# Altium footprint library Connectors THD.PcbLib: 631 footprints (part 13 of 46)
Each footprint in its own frame and in the unit in brackets; x right, y up, seen from the top. Pads: shape width x height; smd on the part's side, far side on the other; paste and mask are expansions set on the pad; w line width, h text height; cw(c..) or ccw(c..) is an arc to the next point about the centre after c.
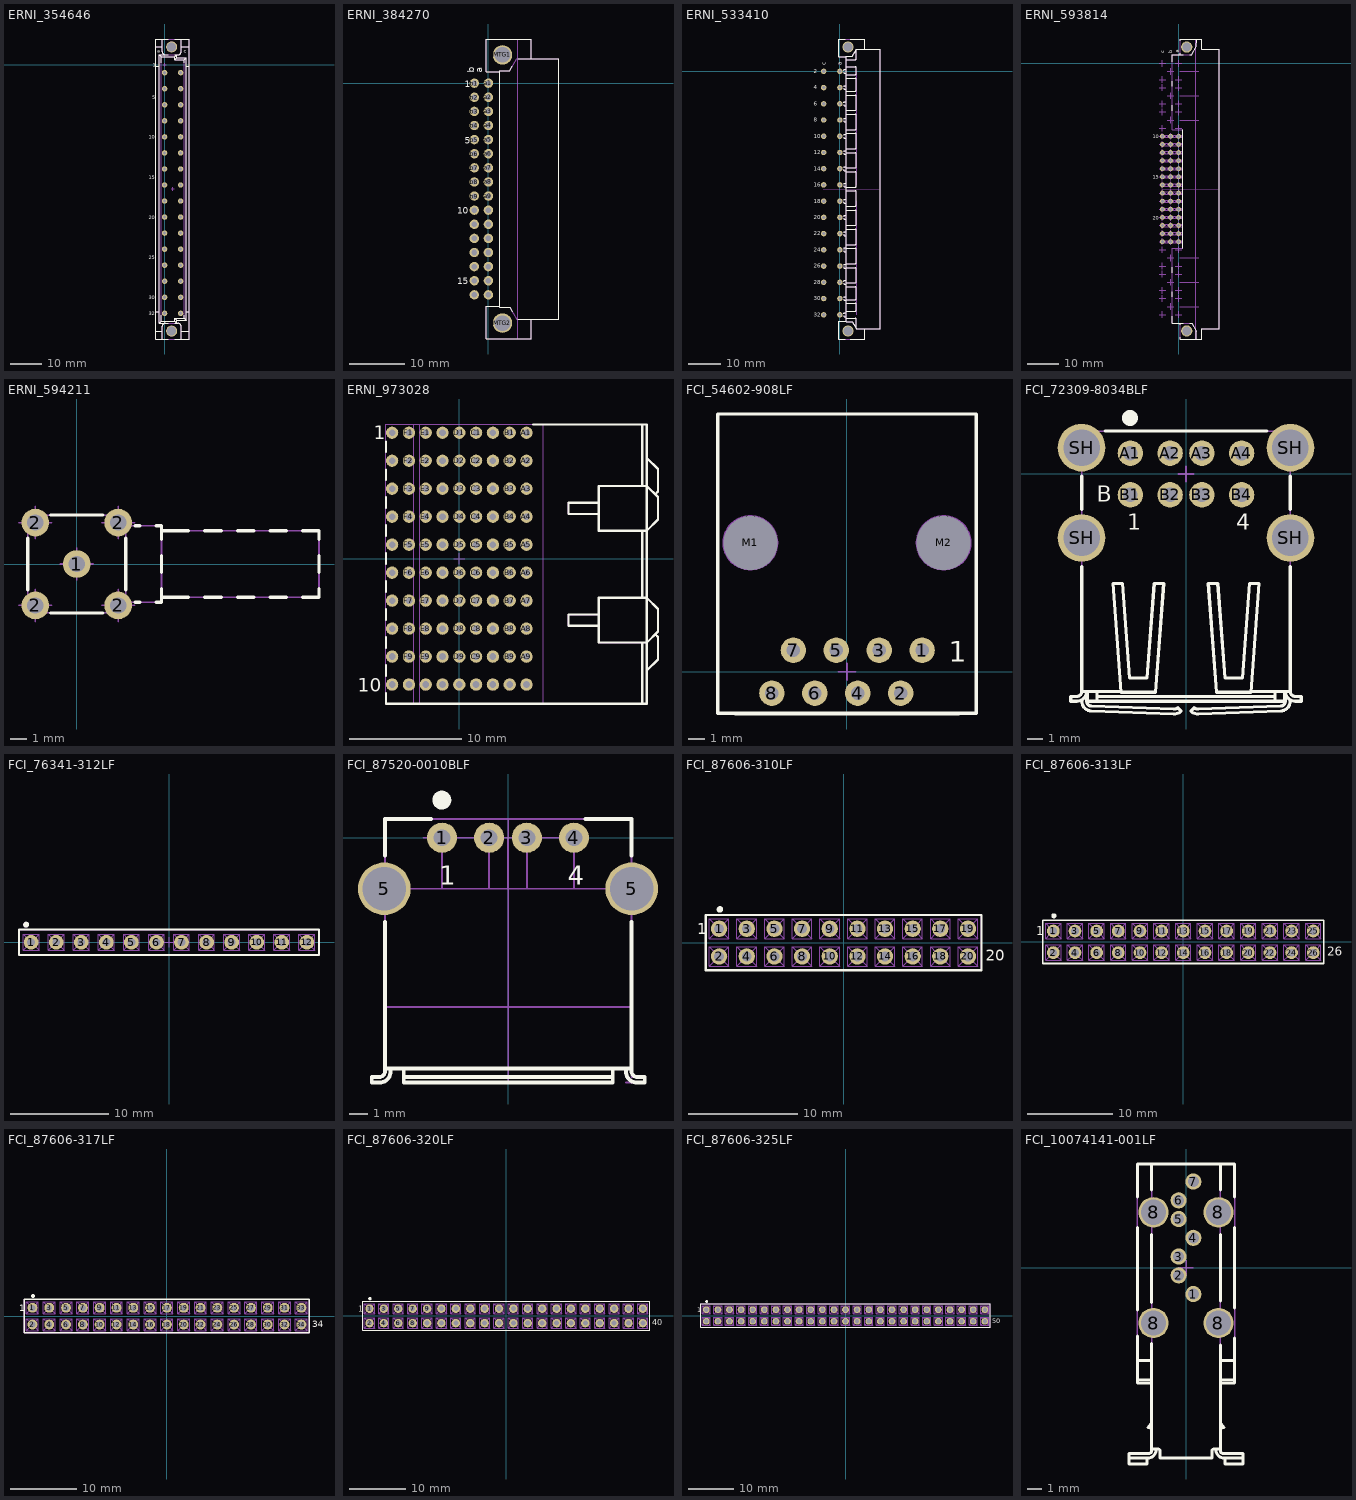
[diagram p12: the footprints below, top view; thin cyan lines are the x and y axes]

## ERNI_354646 [mm] "DIN 41612, Type D, Thru-Hole Pressfit Termination; Rows a+c, 32 Position, Performance level 2, Lead 4.5mm, Pitch 5.08mm, Straight Female Connector"
height 11.6
pads (34):
  round 1.7 hole 1: a2(0,-2.54) a4(0,-7.62) a6(0,-12.7) a8(0,-17.78) a10(0,-22.86) a12(0,-27.94) a14(0,-33.02) a16(0,-38.1) a18(0,-43.18) a20(0,-48.26) a22(0,-53.34) a24(0,-58.42) a26(0,-63.5) a28(0,-68.58) a30(0,-73.66) a32(0,-78.74) c2(5.08,-2.54) c4(5.08,-7.62) c6(5.08,-12.7) c8(5.08,-17.78) c10(5.08,-22.86) c12(5.08,-27.94) c14(5.08,-33.02) c16(5.08,-38.1) c18(5.08,-43.18) c20(5.08,-48.26) c22(5.08,-53.34) c24(5.08,-58.42) c26(5.08,-63.5) c28(5.08,-68.58) c30(5.08,-73.66) c32(5.08,-78.74)
  round 3.5 / inner round 3.5 / far side round 5.1 hole 2.8: MTG1(2.24,5.63) MTG2(2.24,-84.37)
Top Overlay:
  lines w0.2: -2.76,-84.47 -0.76,-84.47 ; -2.76,-78.27 -1.71,-78.27 ; -2.76,-0.47 -1.71,-0.47 ; -2.76,5.73 -0.76,5.73 ; -1.11,-79.315 -1.11,-81.27 ; -1.11,0.575 -1.11,2.53 ; -0.76,-86.87 -0.76,-82.87 cw(c0.24,-82.87) 0.24,-81.87 1.22,-81.87 -1.71,-81.87 ; -0.76,8.13 -0.76,4.13 ccw(c0.24,4.13) 0.24,3.13 1.22,3.13 -1.71,3.13 ; 1.22,-86.87 -2.76,-86.87 -2.76,8.13 1.22,8.13 ; 3.26,-86.87 7.84,-86.87 7.84,8.13 3.26,8.13 ; 5.24,-86.87 5.24,-82.87 ccw(c4.24,-82.87) 4.24,-81.87 3.26,-81.87 3.79,-81.87 ; 5.24,-84.47 7.84,-84.47 ; 5.24,5.73 7.84,5.73 ; 5.24,8.13 5.24,4.13 cw(c4.24,4.13) 4.24,3.13 3.26,3.13 3.79,3.13 ; 6.19,-79.315 6.19,-80.27 ; 6.19,0.575 6.19,1.53 ; 6.79,-78.27 7.84,-78.27 ; 6.79,-0.47 7.84,-0.47 ; -1.71,-81.87 -1.71,3.13 ; -1.71,-81.87 -1.11,-81.27 ; -1.71,3.13 -1.11,2.53 ; -1.11,-81.27 3.19,-81.27 ; -1.11,2.53 3.19,2.53 ; 3.19,-81.27 3.19,-80.27 ; 3.19,-81.27 3.79,-81.87 ; 3.19,-80.27 6.19,-80.27 ; 3.19,-80.27 3.79,-80.87 ; 3.19,1.53 3.19,2.53 ; 3.19,1.53 6.19,1.53 ; 3.19,1.53 3.79,2.13 ; 3.19,2.53 3.79,3.13 ; 3.79,-81.87 3.79,-80.87 ; 3.79,-80.87 6.79,-80.87 ; 3.79,2.13 3.79,3.13 ; 3.79,2.13 6.79,2.13 ; 6.19,-80.27 6.79,-80.87 ; 6.19,1.53 6.79,2.13 ; 6.79,-80.87 6.79,2.13
  text "c" at 6.032,3.81 h1.2
  text "a" at -2.286,3.81 h1.2
  text "32" at -5.05,-79.415 h1.2
  text "5" at -3.925,-10.885 h1.2
  text "10" at -5.05,-23.535 h1.2
  text "30" at -5.05,-74.335 h1.2
  text "25" at -5.05,-61.635 h1.2
  text "20" at -5.05,-48.935 h1.2
  text "15" at -5.05,-36.235 h1.2
  text "1" at -3.725,-0.725 h1.2
Mechanical 8:
  lines w0.1: -0.5,-78.74 0,-78.74 ; -0.5,-73.66 0,-73.66 ; -0.5,-2.54 0,-2.54 ; -0.5,0 0,0 ; 0,-79.24 0,-78.74 ; 0,-78.24 0,-78.74 ; 0,-74.16 0,-73.66 ; 0,-73.16 0,-73.66 ; 0,-3.04 0,-2.54 ; 0,-2.04 0,-2.54 ; 0,-0.5 0,0 ; 0,0.5 0,0 ; 0.5,-78.74 0,-78.74 ; 0.5,-73.66 0,-73.66 ; 0.5,-2.54 0,-2.54 ; 0.5,0 0,0 ; 1.74,-84.37 2.24,-84.37 ; 1.74,5.63 2.24,5.63 ; 2.04,-39.37 2.54,-39.37 ; 2.24,-84.87 2.24,-84.37 ; 2.24,-83.87 2.24,-84.37 ; 2.24,5.13 2.24,5.63 ; 2.24,6.13 2.24,5.63 ; 2.54,-39.87 2.54,-39.37 ; 2.54,-38.87 2.54,-39.37 ; 2.74,-84.37 2.24,-84.37 ; 2.74,5.63 2.24,5.63 ; 3.04,-39.37 2.54,-39.37 ; 4.58,-78.74 5.08,-78.74 ; 4.58,-73.66 5.08,-73.66 ; 4.58,-2.54 5.08,-2.54 ; 5.08,-79.24 5.08,-78.74 ; 5.08,-78.24 5.08,-78.74 ; 5.08,-74.16 5.08,-73.66 ; 5.08,-73.16 5.08,-73.66 ; 5.08,-3.04 5.08,-2.54 ; 5.08,-2.04 5.08,-2.54 ; 5.58,-78.74 5.08,-78.74 ; 5.58,-73.66 5.08,-73.66 ; 5.58,-2.54 5.08,-2.54
Mechanical 14:
  circle w0.1: c2.24,-84.37 r1.4
  circle w0.1: c2.24,5.63 r1.4
  circle w0.1: c2.24,-84.37 r1.425
  circle w0.1: c2.24,5.63 r1.425
  lines w0.1: -2.76,-84.47 -0.76,-84.47 ; -2.76,-78.27 -1.71,-78.27 ; -2.76,-0.47 -1.71,-0.47 ; -2.76,5.73 -0.76,5.73 ; -0.76,-86.87 -0.76,-82.87 cw(c0.24,-82.87) 0.24,-81.87 4.24,-81.87 cw(c4.24,-82.87) 5.24,-82.87 5.24,-86.87 ; -0.76,8.13 -0.76,4.13 ccw(c0.24,4.13) 0.24,3.13 4.24,3.13 ccw(c4.24,4.13) 5.24,4.13 5.24,8.13 ; 5.24,-84.47 7.84,-84.47 ; 5.24,5.73 7.84,5.73 ; 6.79,-78.27 7.84,-78.27 ; 6.79,-0.47 7.84,-0.47 ; -1.71,-81.87 3.79,-81.87 ; -1.71,-81.87 -1.71,3.13 ; -1.71,-81.87 -1.11,-81.27 ; -1.71,3.13 3.79,3.13 ; -1.71,3.13 -1.11,2.53 ; -1.11,-81.27 3.19,-81.27 ; -1.11,-81.27 -1.11,2.53 ; -1.11,2.53 3.19,2.53 ; 3.19,-81.27 3.19,-80.27 ; 3.19,-81.27 3.79,-81.87 ; 3.19,-80.27 6.19,-80.27 ; 3.19,-80.27 3.79,-80.87 ; 3.19,1.53 3.19,2.53 ; 3.19,1.53 6.19,1.53 ; 3.19,1.53 3.79,2.13 ; 3.19,2.53 3.79,3.13 ; 3.79,-81.87 3.79,-80.87 ; 3.79,-80.87 6.79,-80.87 ; 3.79,2.13 3.79,3.13 ; 3.79,2.13 6.79,2.13 ; 6.19,-80.27 6.19,1.53 ; 6.19,-80.27 6.79,-80.87 ; 6.19,1.53 6.79,2.13 ; 6.79,-80.87 6.79,2.13 ; -2.76,-86.87 7.84,-86.87 7.84,8.13 -2.76,8.13 -2.76,-86.87
  text "1" at -3.725,-0.725 h1.2
  text "c" at 6.032,3.81 h1.2
  text "a" at -2.286,3.81 h1.2
  text "32" at -5.05,-79.415 h1.2
  text "5" at -3.925,-10.885 h1.2
  text "10" at -5.05,-23.535 h1.2
  text "15" at -5.05,-36.235 h1.2
  text "20" at -5.05,-48.935 h1.2
  text "25" at -5.05,-61.635 h1.2
  text "30" at -5.05,-74.335 h1.2
Drill Drawing:
  lines w0.1: -2.54,-58.42 -2.54,-81.28 7.62,-81.28 7.62,0 -2.54,0 -2.54,-20.32
  text "PRESS-FIT TECHNOLOGY diam. 1mm +0.09 -0.06" at -1.905,-56.515 h1
3D body: height 11.5, standoff -4.3, extent -2.76,-86.87 7.84,8.13

## ERNI_384270 [mm] "DIN 41612, Type 2B, Thru-Hole Pressfit Terminations;  Rows a+b, 32 Positions, Performance Class 2, Lead 3 mm, Pitch 2.54mm, Right Angle Male Connector"
height 8.6
pads (34):
  round 1.7 hole 1: a1(0,0) a2(0,-2.54) a3(0,-5.08) a4(0,-7.62) a5(0,-10.16) a6(0,-12.7) a7(0,-15.24) a8(0,-17.78) a9(0,-20.32) a10(0,-22.86) a11(0,-25.4) a12(0,-27.94) a13(0,-30.48) a14(0,-33.02) a15(0,-35.56) a16(0,-38.1) b1(-2.54,0) b2(-2.54,-2.54) b3(-2.54,-5.08) b4(-2.54,-7.62) b5(-2.54,-10.16) b6(-2.54,-12.7) b7(-2.54,-15.24) b8(-2.54,-17.78) b9(-2.54,-20.32) b10(-2.54,-22.86) b11(-2.54,-25.4) b12(-2.54,-27.94) b13(-2.54,-30.48) b14(-2.54,-33.02) b15(-2.54,-35.56) b16(-2.54,-38.1)
  round 3.5 / inner round 3.5 / far side round 5.1 hole 2.8: MTG1(2.54,5.08) MTG2(2.54,-43.18)
Top Overlay:
  lines w0.2: 2.04,-40.18 -0.36,-40.18 -0.36,-46.05 7.69,-46.05 7.69,-42.5 ; 2.04,2.08 -0.36,2.08 -0.36,7.95 7.69,7.95 7.69,4.4 ; 4.32,-41.15 3.847,-40.33 2.04,-40.33 2.04,2.23 3.847,2.23 4.32,3.05 ; 5.3,-42.5 12.64,-42.5 12.64,4.4 5.3,4.4
  text "10" at -5.58,-23.535 h1.2
  text "5" at -4.255,-10.885 h1.2
  text "a" at -1.12,1.87 h1.2
  text "b" at -2.56,1.87 h1.2
  text "1" at -4.255,-0.725 h1.2
  text "15" at -5.58,-36.235 h1.2
Mechanical 8:
  drawing of 209 lines, arcs and shapes, not listed
  text "PCB" at 5.055,-19.45 h1.2
Mechanical 14:
  circle w0.1: c2.54,5.08 r1.25
  circle w0.1: c2.54,-43.18 r1.25
  lines w0.1: 2.04,-40.18 -0.36,-40.18 -0.36,-46.05 7.69,-46.05 7.69,-42.5 ; 2.04,2.08 -0.36,2.08 -0.36,7.95 7.69,7.95 7.69,4.4 ; 2.04,-40.33 3.847,-40.33 5.1,-42.5 12.64,-42.5 12.64,4.4 5.1,4.4 3.847,2.23 2.04,2.23 2.04,-40.33
  text "5" at -4.255,-10.885 h1.2
  text "1" at -4.255,-0.725 h1.2
  text "10" at -5.58,-23.535 h1.2
  text "15" at -5.58,-36.235 h1.2
Drill Drawing:
  lines w0.1: -3.9,-40.33 1.4,-40.33 1.4,2.08 -3.9,2.08 -3.9,-40.33
  text "PRESS-FIT TECHNOLOGY diam. 1mm +0.09 -0.06" at 3,-37.1 h1
3D body: height 6.83, standoff -3, extent -2.79,-46.05 12.64,7.95

## ERNI_533410 [mm] "Eurocard DIN 41612, Type C, 32 Position, Rows a+c, Performance level 2, Male, Lead 3.0 mm, Pitch 2.54 mm"
height 11
pads (34):
  round 1.7 hole 1: a2(0,0) a4(0,-5.08) a6(0,-10.16) a8(0,-15.24) a10(0,-20.32) a12(0,-25.4) a14(0,-30.48) a16(0,-35.56) a18(0,-40.64) a20(0,-45.72) a22(0,-50.8) a24(0,-55.88) a26(0,-60.96) a28(0,-66.04) a30(0,-71.12) a32(0,-76.2) c2(-5.08,0) c4(-5.08,-5.08) c6(-5.08,-10.16) c8(-5.08,-15.24) c10(-5.08,-20.32) c12(-5.08,-25.4) c14(-5.08,-30.48) c16(-5.08,-35.56) c18(-5.08,-40.64) c20(-5.08,-45.72) c22(-5.08,-50.8) c24(-5.08,-55.88) c26(-5.08,-60.96) c28(-5.08,-66.04) c30(-5.08,-71.12) c32(-5.08,-76.2)
  round 3.5 / inner round 3.5 / far side round 5.1 hole 2.8: MTG1(2.54,7.62) MTG2(2.54,-81.28)
Top Overlay:
  drawing of 163 lines, arcs and shapes, not listed
  text "30" at -8.22,-71.695 h1.2
  text "28" at -8.22,-66.615 h1.2
  text "20" at -8.22,-46.295 h1.2
  text "10" at -8.22,-20.895 h1.2
  text "32" at -8.22,-76.775 h1.2
  text "a" at 0.635,1.905 h1.2
  text "c" at -4.445,1.905 h1.2
  text "26" at -8.22,-61.535 h1.2
  text "24" at -8.22,-56.455 h1.2
  text "22" at -8.22,-51.375 h1.2
  text "18" at -8.22,-41.215 h1.2
  text "16" at -8.22,-36.135 h1.2
  text "14" at -8.22,-31.055 h1.2
  text "12" at -8.22,-25.975 h1.2
  text "8" at -8.22,-15.815 h1.2
  text "6" at -8.12,-10.735 h1.2
  text "4" at -8.12,-5.655 h1.2
  text "2" at -8.12,-0.575 h1.2
Mechanical 8:
  lines w0.1: -5.08,-36.83 12.64,-36.83
  text "PCB" at 5.08,-38.735 h1.2
Mechanical 14:
  drawing of 163 lines, arcs and shapes, not listed
  text "2" at -8.12,-0.575 h1.2
  text "4" at -8.12,-5.655 h1.2
  text "6" at -8.12,-10.735 h1.2
  text "8" at -8.22,-15.815 h1.2
  text "12" at -8.22,-25.975 h1.2
  text "14" at -8.22,-31.055 h1.2
  text "16" at -8.22,-36.135 h1.2
  text "18" at -8.22,-41.215 h1.2
  text "22" at -8.22,-51.375 h1.2
  text "24" at -8.22,-56.455 h1.2
  text "26" at -8.22,-61.535 h1.2
  text "32" at -8.22,-76.775 h1.2
  text "10" at -8.22,-20.895 h1.2
  text "20" at -8.22,-46.295 h1.2
  text "28" at -8.22,-66.615 h1.2
  text "30" at -8.22,-71.695 h1.2
  text "c" at -4.445,1.905 h1.2
  text "a" at 0.635,1.905 h1.2
  text "PCB" at 6.05,-40.1 h1.2
3D body: height 9.4, standoff -3, extent -5.38,-83.83 12.64,10.17

## ERNI_593814 [mm] "DIN 41612, Type M, 42 Contacts + 6 Spares  Positions for Specials Contacts, Right Angle Male Connector, Pitch 2.54 mm"
height 11
pads (44):
  round 1.5 hole 1: a10(0,-22.86) a11(0,-25.4) a12(0,-27.94) a13(0,-30.48) a14(0,-33.02) a15(0,-35.56) a16(0,-38.1) a17(0,-40.64) a18(0,-43.18) a19(0,-45.72) a20(0,-48.26) a21(0,-50.8) a22(0,-53.34) a23(0,-55.88) b10(-2.54,-22.86) b11(-2.54,-25.4) b12(-2.54,-27.94) b13(-2.54,-30.48) b14(-2.54,-33.02) b15(-2.54,-35.56) b16(-2.54,-38.1) b17(-2.54,-40.64) b18(-2.54,-43.18) b19(-2.54,-45.72) b20(-2.54,-48.26) b21(-2.54,-50.8) b22(-2.54,-53.34) b23(-2.54,-55.88) c10(-5.08,-22.86) c11(-5.08,-25.4) c12(-5.08,-27.94) c13(-5.08,-30.48) c14(-5.08,-33.02) c15(-5.08,-35.56) c16(-5.08,-38.1) c17(-5.08,-40.64) c18(-5.08,-43.18) c19(-5.08,-45.72) c20(-5.08,-48.26) c21(-5.08,-50.8) c22(-5.08,-53.34) c23(-5.08,-55.88)
  round 3.5 / inner round 3.5 / far side round 5.1 hole 2.8: MTG1(2.54,5.08) MTG2(2.54,-83.82)
Top Overlay:
  lines w0.2: -1.965,0.46 -1.96,2.63 1.5,2.63 ; -1.963,-73.2 -1.96,-71.58 ; -1.963,-65.58 -1.96,-63.96 ; -1.963,-14.78 -1.96,-13.16 ; -1.963,-7.16 -1.96,-5.54 ; -1.955,-79.2 -1.96,-81.37 1.5,-81.37 ; 0.54,-85.857 0.54,-86.37 7.24,-86.37 7.24,-83.17 12.74,-83.17 12.74,4.43 7.24,4.43 7.24,7.63 0.54,7.63 0.54,7.117 ; 0.54,-81.883 0.54,-81.37 ; 0.54,2.63 0.54,3.143 ; 1.29,-57.94 1.29,-20.8 ; 3.5,-81.37 4.04,-81.37 5.54,-83.87 5.54,-86.37 ; 3.5,2.63 4.04,2.63 5.54,5.13 5.64,7.63
  text "c" at -4.58,3.22 h1.2
  text "b" at -2.04,3.22 h1.2
  text "a" at 0,3.302 h1.2
  text "10" at -8.12,-23.535 h1.2
  text "15" at -8.12,-36.235 h1.2
  text "20" at -8.12,-48.935 h1.2
Mechanical 8:
  drawing of 314 lines, arcs and shapes, not listed
  text "PCB" at 5.08,-41.275 h1.2
Mechanical 14:
  lines w0.1: 0.54,-81.37 0.54,-86.37 7.24,-86.37 7.24,-83.17 12.74,-83.17 12.74,4.43 7.24,4.43 7.24,7.63 0.54,7.63 0.54,2.63 ; 1.29,-56.23 -5.38,-56.23 -5.38,-55.53 1.295,-55.53 ; 1.29,-53.69 -5.38,-53.69 -5.38,-52.99 1.295,-52.99 ; 1.29,-51.15 -5.38,-51.15 -5.38,-50.45 1.295,-50.45 ; 1.29,-48.61 -5.38,-48.61 -5.38,-47.91 1.295,-47.91 ; 1.29,-46.07 -5.38,-46.07 -5.38,-45.37 1.295,-45.37 ; 1.29,-43.53 -5.38,-43.53 -5.38,-42.83 1.295,-42.83 ; 1.29,-40.99 -5.38,-40.99 -5.38,-40.29 1.295,-40.29 ; 1.29,-38.45 -5.38,-38.45 -5.38,-37.75 1.295,-37.75 ; 1.29,-35.91 -5.38,-35.91 -5.38,-35.21 1.295,-35.21 ; 1.29,-33.37 -5.38,-33.37 -5.38,-32.67 1.295,-32.67 ; 1.29,-30.83 -5.38,-30.83 -5.38,-30.13 1.295,-30.13 ; 1.29,-28.29 -5.38,-28.29 -5.38,-27.59 1.295,-27.59 ; 1.29,-25.75 -5.38,-25.75 -5.38,-25.05 1.295,-25.05 ; 1.29,-23.21 -5.38,-23.21 -5.38,-22.51 1.295,-22.51 ; 5.54,-86.37 5.54,-83.87 4.04,-81.37 -1.96,-81.37 -1.96,-57.94 1.29,-57.94 1.29,-20.8 -1.96,-20.8 -1.96,2.63 4.04,2.63 5.54,5.13 5.64,7.63
  text "10" at -8.12,-23.535 h1.2
  text "20" at -8.12,-48.935 h1.2
3D body: height 9.4, standoff -3, extent -5.38,-86.37 12.74,7.63

## ERNI_594211 [mm] "Special Contacts for DIN Connectors, Coax Right Angle Female"
height 6
pads (5):
  round 1.7 hole 1: 1(0,0) 2(-2.54,-2.54) 2(-2.54,2.54) 2(2.54,-2.54) 2(2.54,2.54)
Top Overlay:
  lines w0.2: -3,-1.596 -3,1.596 ; -1.596,-3 1.596,-3 ; -1.596,3 1.596,3 ; 3,-1.596 3,1.596 ; 3.573,-2.35 3.86,-2.35 ; 3.573,2.35 3.86,2.35 ; 4.86,-2.35 5.2,-2.35 5.2,-1.5 ; 4.86,2.35 5.2,2.35 5.2,1.5 ; 5.2,-2.035 6.86,-2.035 ; 5.2,-0.5 5.2,0.5 ; 5.2,2.035 6.86,2.035 ; 7.86,-2.035 8.86,-2.035 ; 7.86,2.035 8.86,2.035 ; 9.86,-2.035 10.86,-2.035 ; 9.86,2.035 10.86,2.035 ; 11.86,-2.035 12.86,-2.035 ; 11.86,2.035 12.86,2.035 ; 13.86,-2.035 14.86,-2.035 ; 13.86,2.035 14.86,2.035 14.86,1.5 ; 14.86,-2.035 14.86,-1.5 14.86,-2.035 ; 14.86,-0.5 14.86,0.5 14.86,-0.5
Mechanical 8:
  lines w0.1: -3.54,-2.54 -2.54,-2.54 ; -3.54,2.54 -2.54,2.54 ; -2.54,-3.54 -2.54,-2.54 ; -2.54,-1.54 -2.54,-2.54 ; -2.54,1.54 -2.54,2.54 ; -2.54,3.54 -2.54,2.54 ; -1.54,-2.54 -2.54,-2.54 ; -1.54,2.54 -2.54,2.54 ; -1,0 0,0 ; 0,-1 0,0 ; 0,1 0,0 ; 1,0 0,0 ; 1.54,-2.54 2.54,-2.54 ; 1.54,2.54 2.54,2.54 ; 2.54,-3.54 2.54,-2.54 ; 2.54,-1.54 2.54,-2.54 ; 2.54,1.54 2.54,2.54 ; 2.54,3.54 2.54,2.54 ; 3.54,-2.54 2.54,-2.54 ; 3.54,2.54 2.54,2.54
Mechanical 14:
  lines w0.1: 3,-2.35 5.2,-2.35 5.2,2.35 3,2.35 ; 5.2,-2.035 14.86,-2.035 14.86,2.035 5.2,2.035 ; -3,-3 -3,3 3,3 3,-3 -3,-3
3D body: height 6.85, standoff -2.75, extent -3,-3 14.86,3

## ERNI_973028 [mm] "90 Contacts (30 pairs/10Wafer), 6 Rows  (a,b,c,d,e,f) of 10 positions + 3 Shield Row (ab, cd, ef) of  10 Positions, Pitch 2 mm,  Press-Fit, Right Angle ERmet ZD High Speed Differential Hard Metric Female Connector"
height 16.9
pads (90):
  round 1.1 hole 0.6: A1(6,11.25) A2(6,8.75) A3(6,6.25) A4(6,3.75) A5(6,1.25) A6(6,-1.25) A7(6,-3.75) A8(6,-6.25) A9(6,-8.75) A10(6,-11.25) AB1(3,11.25) AB2(3,8.75) AB3(3,6.25) AB4(3,3.75) AB5(3,1.25) AB6(3,-1.25) AB7(3,-3.75) AB8(3,-6.25) AB9(3,-8.75) AB10(3,-11.25) B1(4.5,11.25) B2(4.5,8.75) B3(4.5,6.25) B4(4.5,3.75) B5(4.5,1.25) B6(4.5,-1.25) B7(4.5,-3.75) B8(4.5,-6.25) B9(4.5,-8.75) B10(4.5,-11.25) C1(1.5,11.25) C2(1.5,8.75) C3(1.5,6.25) C4(1.5,3.75) C5(1.5,1.25) C6(1.5,-1.25) C7(1.5,-3.75) C8(1.5,-6.25) C9(1.5,-8.75) C10(1.5,-11.25) CD1(-1.5,11.25) CD2(-1.5,8.75) CD3(-1.5,6.25) CD4(-1.5,3.75) CD5(-1.5,1.25) CD6(-1.5,-1.25) CD7(-1.5,-3.75) CD8(-1.5,-6.25) CD9(-1.5,-8.75) CD10(-1.5,-11.25) D1(0,11.25) D2(0,8.75) D3(0,6.25) D4(0,3.75) D5(0,1.25) D6(0,-1.25) D7(0,-3.75) D8(0,-6.25) D9(0,-8.75) D10(0,-11.25) E1(-3,11.25) E2(-3,8.75) E3(-3,6.25) E4(-3,3.75) E5(-3,1.25) E6(-3,-1.25) E7(-3,-3.75) E8(-3,-6.25) E9(-3,-8.75) E10(-3,-11.25) EF1(-6,11.25) EF2(-6,8.75) EF3(-6,6.25) EF4(-6,3.75) EF5(-6,1.25) EF6(-6,-1.25) EF7(-6,-3.75) EF8(-6,-6.25) EF9(-6,-8.75) EF10(-6,-11.25) F1(-4.5,11.25) F2(-4.5,8.75) F3(-4.5,6.25) F4(-4.5,3.75) F5(-4.5,1.25) F6(-4.5,-1.25) F7(-4.5,-3.75) F8(-4.5,-6.25) F9(-4.5,-8.75) F10(-4.5,-11.25)
Top Overlay:
  lines w0.2: -6.55,-12.025 -6.55,-12.955 16.75,-12.955 16.75,11.995 6.589,11.995 ; -6.55,-10.475 -6.55,-9.525 ; -6.55,-7.975 -6.55,-7.025 ; -6.55,-5.475 -6.55,-4.525 ; -6.55,-2.975 -6.55,-2.025 ; -6.55,-0.475 -6.55,0.475 ; -6.55,2.025 -6.55,2.975 ; -6.55,4.525 -6.55,5.475 ; -6.55,7.025 -6.55,7.975 ; -6.55,9.525 -6.55,10.475 ; 12.45,-6 9.75,-6 9.75,-5 12.45,-5 ; 12.45,4 9.75,4 9.75,5 12.45,5 ; 16.35,6.5 16.35,11.995 ; 16.351,-12.955 16.351,-7.5 ; 16.351,-3.5 16.351,2.5 ; 16.75,-10 17.75,-9 17.75,-7 17.5,-6.75 ; 16.75,9 17.75,8 17.75,6 17.5,5.75 ; 12.45,-7.5 16.75,-7.5 17.75,-6.5 17.75,-4.5 16.75,-3.5 12.45,-3.5 12.45,-7.5 ; 12.45,2.5 16.75,2.5 17.75,3.5 17.75,5.5 16.75,6.5 12.45,6.5 12.45,2.5
  text "10" at -9.05,-11.875 h1.2
  text "1" at -7.65,10.675 h1.2
Mechanical 8:
  drawing of 366 lines, arcs and shapes, not listed
Mechanical 14:
  lines w0.1: -4.05,-12.955 -4.05,11.995 ; -3.55,-12.955 -3.55,11.995 ; 12.45,-6 9.75,-6 9.75,-5 12.45,-5 ; 12.45,4 9.75,4 9.75,5 12.45,5 ; 16.35,6.5 16.35,11.995 ; 16.351,-12.955 16.351,-7.5 ; 16.351,-3.5 16.351,2.5 ; 16.75,-10 17.75,-9 17.75,-7 17.5,-6.75 ; 16.75,9 17.75,8 17.75,6 17.5,5.75 ; -6.55,-12.955 16.75,-12.955 16.75,11.995 -6.55,11.995 -6.55,-12.955 ; 12.45,-7.5 16.75,-7.5 17.75,-6.5 17.75,-4.5 16.75,-3.5 12.45,-3.5 12.45,-7.5 ; 12.45,2.5 16.75,2.5 17.75,3.5 17.75,5.5 16.75,6.5 12.45,6.5 12.45,2.5
  text "10" at -9.05,-11.875 h1.2
  text "1" at -7.65,10.675 h1.2
Drill Drawing:
  lines w0.1: -6.55,-12.005 -6.55,11.995 ; -6.55,-12 6.815,-12 6.815,12 -6.55,12
  text "diam. 0.6mm +/-0.05" at 9.875,-8.35 h1
  text "PRESS-FIT TECHNOLOGY" at 8.265,-8.75 h1
3D body: height 12.2, standoff -4.7, extent -6.55,-12.955 17.75,11.995
